# Altium footprint library Library 3D.PcbLib: 288 footprints (part 8 of 18)
Each footprint in its own frame and in the unit in brackets; x right, y up, seen from the top. Pads: shape width x height; smd on the part's side, far side on the other; paste and mask are expansions set on the pad; w line width, h text height; cw(c..) or ccw(c..) is an arc to the next point about the centre after c.
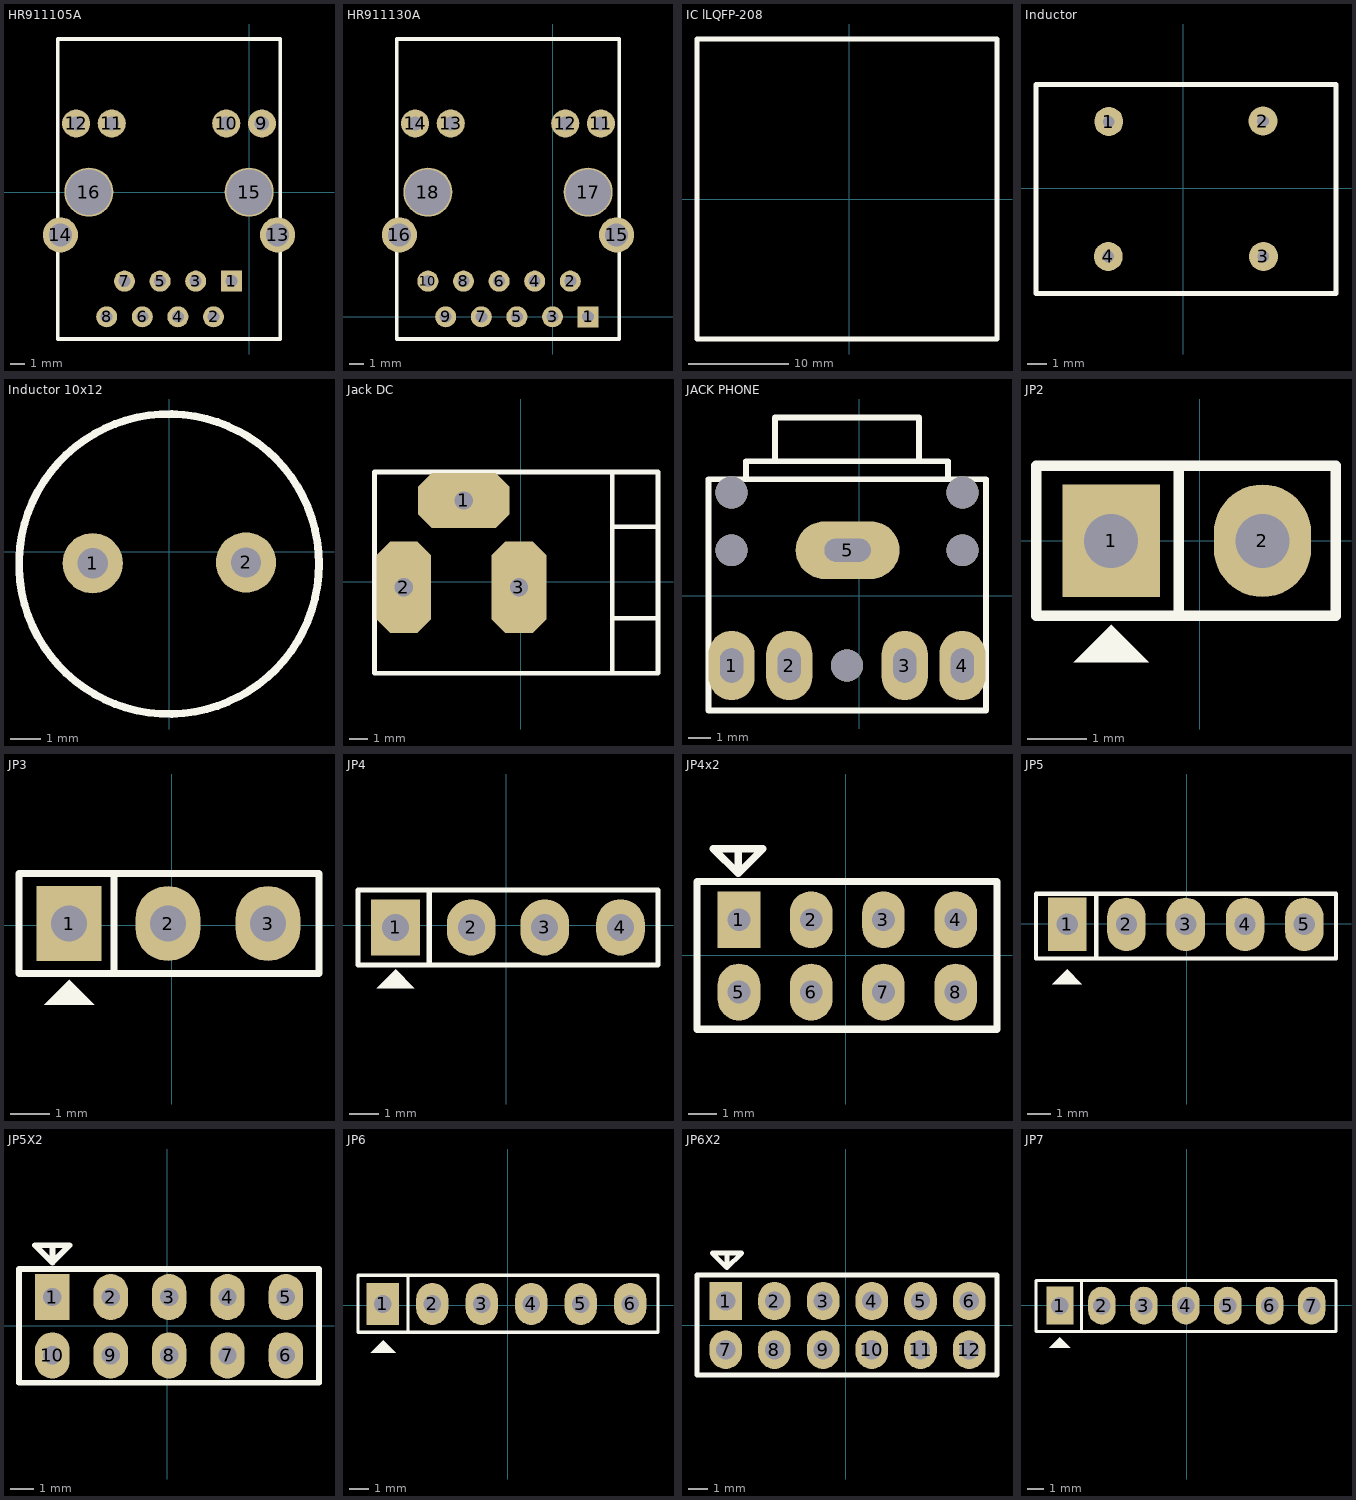
[diagram p7: the footprints below, top view; thin cyan lines are the x and y axes]

## HR911105A [mm]
pads (16):
  rect 1.5x1.5 hole 0.85: 1(-1.27,-6.35)
  round 1.5 hole 0.85: 2(-2.54,-8.89) 3(-3.81,-6.35) 4(-5.08,-8.89) 5(-6.35,-6.35) 6(-7.62,-8.89) 7(-8.89,-6.35) 8(-10.16,-8.89)
  round 2 hole 1.02: 9(0.91,4.9) 10(-1.63,4.9) 11(-9.8,4.9) 12(-12.34,4.9)
  round 2.5 hole 1.63: 13(2.03,-3.05) 14(-13.46,-3.05)
  round 3.5 hole 3.25: 15(0,0) 16(-11.43,0)
Top Overlay:
  lines w0.254: -13.66,-10.475 -13.66,10.925 2.22,10.925 2.22,-10.475 -13.66,-10.475
3D body "User Library-HR911105A.STEP": height 13.6, standoff -2.9, extent -13.66,-10.475 2.22,10.925

## HR911130A [mm]
pads (18):
  rect 1.5x1.5 hole 0.85: 1(2.54,0)
  round 1.5 hole 0.85: 2(1.27,2.54) 3(0,0) 4(-1.27,2.54) 5(-2.54,0) 6(-3.81,2.54) 7(-5.08,0) 8(-6.35,2.54) 9(-7.62,0) 10(-8.89,2.54)
  round 2 hole 1.02: 11(3.45,13.79) 12(0.91,13.79) 13(-7.26,13.79) 14(-9.8,13.79)
  round 2.5 hole 1.63: 15(4.57,5.84) 16(-10.92,5.84)
  round 3.5 hole 3.25: 17(2.54,8.89) 18(-8.89,8.89)
Top Overlay:
  lines w0.254: -11.11,-1.585 4.77,-1.585 4.77,19.815 -11.11,19.815 -11.11,-1.585
3D body "User Library-HR911130A.STEP": height 13.5, standoff -3, extent -11.11,-1.585 4.77,19.815

## IC lLQFP-208 [mm]
Top Overlay:
  lines w0.5: -15.25,-14 -15.25,16 14.75,16 14.75,-14 -15.25,-14
3D body "User Library-LQFP.STEP": height 1.4, standoff -0.31, extent -15.25,-14 14.75,16

## Inductor [mm]
pads (4):
  round 1.5 hole 0.6: 1(-3.875,3.45) 2(4.125,3.475) 3(4.15,-3.55) 4(-3.9,-3.55)
Top Overlay:
  lines w0.254: -7.65,-5.475 7.913,-5.475 7.913,5.375 -7.65,5.375 -7.65,-5.475
3D body "SW3dPS-INDUCTOR, COMMON MODE, 22MH PER SIDE, WAH HING CG00008A.STEP": height 15.45, standoff -3, extent -7.65,-5.475 7.913,5.375

## Inductor 10x12 [mm]
pads (2):
  round 2 hole 1: 1(-2.525,-0.375) 2(2.55,-0.35)
Top Overlay:
  circle w0.254: c0,-0.4 r4.966
3D body "User Library-Inductor 10x12 (200 mils).STEP": height 12.13, standoff -3.87, extent -5,-5.365 5,4.635

## Jack DC [mm]
pads (3):
  oct 5x3 hole 1 square: 1(-3.124,4.445)
  oct 3x5 hole 1 square: 2(-6.4,-0.3) 3(-0.1,-0.3)
Top Overlay:
  lines w0.254: 5,-5 5,5.9 ; 5,-2 7.4,-2 ; 5,3 7.5,3 ; -8,-5 -8,6 7.5,6 7.5,-5 -8,-5
3D body "User Library-DC POWER JACK.STEP": height 11.18, standoff -3.6, extent -7.087,-4.877 7.391,4.595

## JACK PHONE [mil]
pads (5):
  oval 80x120 hole 40 slot 60 at 90 deg: 1(-221.65,-120.67) 2(-121.65,-120.67) 3(78.35,-120.67) 4(178.35,-120.67)
  oval 180x100 hole 40 slot 80 at 0 deg: 5(-20.65,79.33)
via -221.65,179.33 diameter 55 hole 55
via 178.35,179.33 diameter 55 hole 55
via -21.65,-120.67 diameter 55 hole 55
via -221.65,79.33 diameter 55 hole 55
via 178.35,79.33 diameter 55 hole 55
Top Overlay:
  lines w10: -261.65,198.33 -261.65,-198.67 ; -196.65,203.33 -196.65,233.33 153.35,233.33 153.35,205.33 152.35,204.33 ; -146.65,234.33 -146.65,309.33 103.35,309.33 ; 103.35,308.33 103.35,235.33 104.35,234.33 ; 218.35,-198.67 -261.65,-198.67 ; -261.65,-198.67 219.35,-198.67 219.35,202.33 -261.65,202.33 -261.65,-198.67
3D body "SW3dPS-CONNECTOR, PHONE JACK, STEREO, 3.5 MM, SEE-PLUS ST-3536-02HG.STEP": height 394.3, standoff -137.19, extent -260.65,-222.23 211.79,332.89

## JP2 [mil]
pads (2):
  rect 65x75 hole 36: 1(-59.06,0)
  oval 65x75 hole 36: 2(41.94,0)
Top Overlay:
  region: -59.06,-56 -84.06,-81 -34.06,-81
  lines w7: -14.06,-50 -14.06,49 ; -109.06,-50 -109.06,50 90.94,50 90.94,-50 -109.06,-50
3D body "JP2.stp": height 323.44, standoff -117.51, extent -107.09,-50 88.98,48.43

## JP3 [mil]
pads (3):
  rect 65x75 hole 36: 1(-102.95,1.97)
  oval 65x75 hole 36: 2(-3.94,1.97) 3(96.05,1.97)
Top Overlay:
  region: -102.95,-54.03 -127.95,-79.03 -77.95,-79.03
  lines w7: -57.95,-48.03 -57.95,50.97 ; -152.95,-48.03 -152.95,51.97 147.05,51.97 147.05,-48.03 -152.95,-48.03
3D body "User Library-PinHeaderX3.STEP": height 335.04, standoff -144.88, extent -152.95,-57.99 147.05,56.97

## JP4 [mil]
pads (4):
  rect 65x75 hole 36: 1(-147.87,-3.07)
  oval 65x75 hole 36: 2(-46.87,-3.07) 3(51.13,-3.07) 4(152.13,-3.07)
Top Overlay:
  region: -147.87,-59.07 -172.87,-84.07 -122.87,-84.07
  lines w7: -102.87,-53.07 -102.87,45.93 ; -197.87,-53.07 -197.87,46.93 202.13,46.93 202.13,-53.07 -197.87,-53.07
3D body "JP4.stp": height 323.44, standoff -117.51, extent -195.91,-51.5 200.16,46.93

## JP4x2 [mm]
pads (8):
  rect 1.5x2 hole 0.8: 1(-3.75,1.25)
  oval 1.5x2 hole 0.8: 2(-1.21,1.25) 3(1.33,1.25) 4(3.87,1.25) 5(-3.75,-1.29) 6(-1.21,-1.29) 7(1.33,-1.29) 8(3.87,-1.29)
Top Overlay:
  lines w0.254: -3.775,3.75 -3.775,2.875 ; -3.775,2.875 -4.65,3.75 -2.9,3.75 -3.775,2.875 ; -5.225,-2.6 5.325,-2.6 5.325,2.6 -5.225,2.6 -5.225,-2.6
3D body "JP4x2.STEP": height 8, standoff -3, extent -5.03,-2.4 5.13,2.4

## JP5 [mil]
pads (5):
  rect 65x90 hole 36: 1(-201.38,-1.3)
  oval 65x90 hole 36: 2(-101.38,-1.3) 3(-1.38,-1.3) 4(98.62,-1.3) 5(198.62,-1.3)
Top Overlay:
  region: -201.38,-77.3 -226.38,-102.3 -176.38,-102.3
  lines w7: -152.38,-58.07 -152.38,49.21 ; -253.94,-59.06 -253.94,50.2 251.97,50.2 251.97,-59.06 -253.94,-59.06
3D body "JP1-5.stp": height 323.43, standoff -117.51, extent -249.41,-54.72 246.65,43.7

## JP5X2 [mm]
pads (10):
  rect 1.5x2 hole 0.8: 1(-5,1.25)
  oval 1.5x2 hole 0.8: 2(-2.46,1.25) 3(0.08,1.25) 4(2.62,1.25) 5(5.16,1.25) 6(5.16,-1.29) 7(2.62,-1.29) 8(0.08,-1.29) 9(-2.46,-1.29) 10(-5,-1.29)
Top Overlay:
  lines w0.254: -5,3.45 -5,2.75 ; -5,2.75 -5.75,3.5 -4.25,3.5 -5,2.75 ; -6.45,-2.475 6.6,-2.475 6.6,2.475 -6.45,2.475 -6.45,-2.475
3D body "JP5x2.STEP": height 8.3, standoff -3, extent -6.275,-2.3 6.425,2.3

## JP6 [mil]
pads (6):
  rect 65x85 hole 36: 1(-252.48,2.87)
  oval 65x85 hole 36: 2(-152.48,2.87) 3(-52.48,2.87) 4(47.52,2.87) 5(147.52,2.87) 6(247.52,2.87)
Top Overlay:
  region: -251.48,-71.13 -276.48,-96.13 -226.48,-96.13
  lines w7: -201.48,-54.13 -201.48,58.87 ; -302.48,-54.13 303.52,-54.13 303.52,60.87 -302.48,60.87 -302.48,-54.13
3D body "JP1-6.stp": height 323.43, standoff -117.51, extent -300.51,-47.13 295.55,51.3

## JP6X2 [mm]
pads (12):
  rect 1.7x2 hole 1: 1(-6.25,1.25)
  oval 1.7x2 hole 1: 2(-3.71,1.25) 3(-1.17,1.25) 4(1.37,1.25) 5(3.91,1.25) 6(6.45,1.25) 7(-6.25,-1.29) 8(-3.71,-1.29) 9(-1.17,-1.29) 10(1.37,-1.29) 11(3.91,-1.29) 12(6.45,-1.29)
Top Overlay:
  lines w0.254: -6.188,3.75 -6.188,2.987 ; -6.188,2.987 -6.95,3.75 -5.425,3.75 -6.188,2.987 ; -7.75,-2.6 -7.75,2.6 7.9,2.6 7.9,-2.6 -7.75,-2.6
3D body "JP6x2.STEP": height 8, standoff -3, extent -7.545,-2.4 7.695,2.4

## JP7 [mil]
pads (7):
  rect 65x90 hole 42: 1(-301.77,-0.32)
  oval 65x90 hole 42: 2(-201.77,-0.32) 3(-101.77,-0.32) 4(-1.77,-0.32) 5(98.23,-0.32) 6(198.23,-0.32) 7(298.23,-0.32)
Top Overlay:
  region: -301.77,-75.31 -326.77,-100.31 -276.77,-100.31
  lines w7: -250.77,-58.31 -250.77,59.69 ; -358.77,-62.31 356.23,-62.31 356.23,59.69 -358.77,59.69 -358.77,-62.31
3D body "JP1-7.stp": height 323.44, standoff -117.51, extent -351.77,-49.53 344.29,48.9